# Altium footprint library TranDangKhoa-LIB.PcbLib: 1435 footprints (part 65 of 90)
Each footprint in its own frame and in the unit in brackets; x right, y up, seen from the top. Pads: shape width x height; smd on the part's side, far side on the other; paste and mask are expansions set on the pad; w line width, h text height; cw(c..) or ccw(c..) is an arc to the next point about the centre after c.
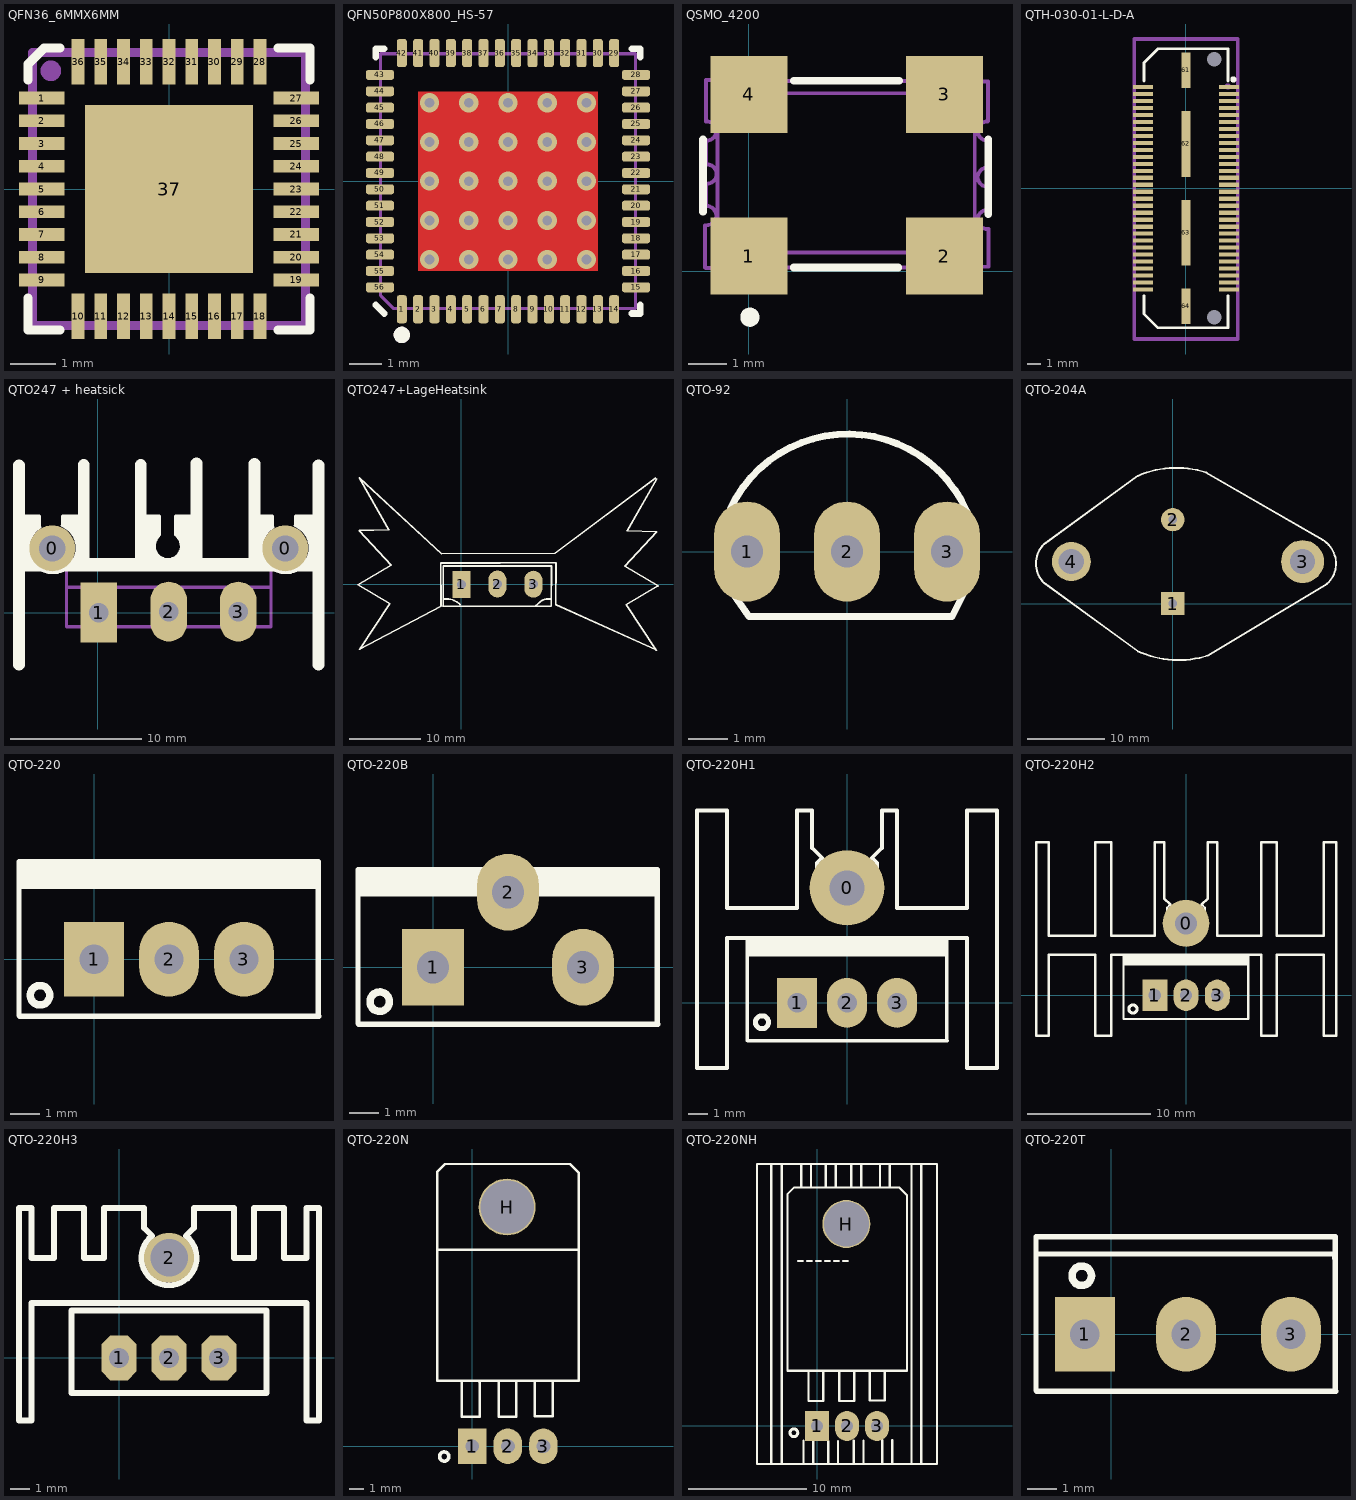
[diagram p64: the footprints below, top view; thin cyan lines are the x and y axes]

## QFN36_6MMX6MM [mm] "Creator MM"
pads (37):
  rect 1x0.28 smd mask+0.025: 1(-2.8,2) 2(-2.8,1.5) 3(-2.8,1) 4(-2.8,0.5) 5(-2.8,0) 6(-2.8,-0.5) 7(-2.8,-1) 8(-2.8,-1.5) 9(-2.8,-2) 19(2.8,-2) 20(2.8,-1.5) 21(2.8,-1) 22(2.8,-0.5) 23(2.8,0) 24(2.8,0.5) 25(2.8,1) 26(2.8,1.5) 27(2.8,2)
  rect 0.28x1 smd mask+0.025: 10(-2,-2.8) 11(-1.5,-2.8) 12(-1,-2.8) 13(-0.5,-2.8) 14(0,-2.8) 15(0.5,-2.8) 16(1,-2.8) 17(1.5,-2.8) 18(2,-2.8) 28(2,2.8) 29(1.5,2.8) 30(1,2.8) 31(0.5,2.8) 32(0,2.8) 33(-0.5,2.8) 34(-1,2.8) 35(-1.5,2.8) 36(-2,2.8)
  rect 3.7x3.7 smd paste-10 mask+0.025: 37(0,0)
Top Overlay:
  lines w0.2: -3.1,-2.4 -3.1,-3.1 -2.4,-3.1 ; -3.1,2.4 -3.1,2.75 -2.75,3.1 -2.4,3.1 ; 2.4,-3.1 3.1,-3.1 3.1,-2.4 ; 2.4,3.1 3.1,3.1 3.1,2.4
Top Paste:
  rectangle: -1.7,0.1 -0.1,1.7
  region: -0.1,-1.7 -0.1,-0.1 -1.7,-0.1 -1.7,-1.7
  region: 1.7,-0.1 0.1,-0.1 0.1,-1.7 1.7,-1.7
  region: 0.1,1.7 0.1,0.1 1.7,0.1 1.7,1.7
Mechanical 16:
  circle w0.254: c-2.6,2.6 r0.1
  lines w0.2: -3,-3 -3,3 3,3 3,-3 -3,-3
Mechanical 29:
  text ".Designator" at -1.2,-0.6 h1.2
3D body "QFN36 (6x6).step": height 0.9, standoff 0.01, extent -3.103,-3.103 3.102,3.102

## QFN50P800X800_HS-57 [mm]
pads (56):
  rrect50% 0.305x0.86 smd mask+0.051: 1(-3.25,-3.92) 14(3.25,-3.92) 29(3.25,3.92) 42(-3.25,3.92)
  rrect50% 0.305x0.86 smd mask+0.038: 2(-2.75,-3.92) 3(-2.25,-3.92) 4(-1.75,-3.92) 5(-1.25,-3.92) 6(-0.75,-3.92) 7(-0.25,-3.92) 8(0.25,-3.92) 9(0.75,-3.92) 10(1.25,-3.92) 11(1.75,-3.92) 12(2.25,-3.92) 13(2.75,-3.92) 30(2.75,3.92) 31(2.25,3.92) 32(1.75,3.92) 33(1.25,3.92) 34(0.75,3.92) 35(0.25,3.92) 36(-0.25,3.92) 37(-0.75,3.92) 38(-1.25,3.92) 39(-1.75,3.92) 40(-2.25,3.92) 41(-2.75,3.92)
  rrect50% 0.86x0.305 smd mask+0.051: 15(3.92,-3.25) 28(3.92,3.25) 43(-3.92,3.25) 56(-3.92,-3.25)
  rrect50% 0.86x0.305 smd mask+0.038: 16(3.92,-2.75) 17(3.92,-2.25) 18(3.92,-1.75) 19(3.92,-1.25) 20(3.92,-0.75) 21(3.92,-0.25) 22(3.92,0.25) 23(3.92,0.75) 24(3.92,1.25) 25(3.92,1.75) 26(3.92,2.25) 27(3.92,2.75) 44(-3.92,2.75) 45(-3.92,2.25) 46(-3.92,1.75) 47(-3.92,1.25) 48(-3.92,0.75) 49(-3.92,0.25) 50(-3.92,-0.25) 51(-3.92,-0.75) 52(-3.92,-1.25) 53(-3.92,-1.75) 54(-3.92,-2.25) 55(-3.92,-2.75)
via -2.4,-1.2 diameter 0.584 hole 0.3
via -2.4,0 diameter 0.584 hole 0.3
via -2.4,-2.4 diameter 0.584 hole 0.3
via -2.4,1.2 diameter 0.584 hole 0.3
via -2.4,2.4 diameter 0.584 hole 0.3
via -1.2,-1.2 diameter 0.584 hole 0.3
via -1.2,0 diameter 0.584 hole 0.3
via -1.2,-2.4 diameter 0.584 hole 0.3
via -1.2,1.2 diameter 0.584 hole 0.3
via -1.2,2.4 diameter 0.584 hole 0.3
via 0,-1.2 diameter 0.584 hole 0.3
via 0,0 diameter 0.584 hole 0.3
via 0,-2.4 diameter 0.584 hole 0.3
via 0,1.2 diameter 0.584 hole 0.3
via 0,2.4 diameter 0.584 hole 0.3
via 1.2,-1.2 diameter 0.584 hole 0.3
via 1.2,0 diameter 0.584 hole 0.3
via 1.2,-2.4 diameter 0.584 hole 0.3
via 1.2,1.2 diameter 0.584 hole 0.3
via 1.2,2.4 diameter 0.584 hole 0.3
via 2.4,-1.2 diameter 0.584 hole 0.3
via 2.4,0 diameter 0.584 hole 0.3
via 2.4,-2.4 diameter 0.584 hole 0.3
via 2.4,1.2 diameter 0.584 hole 0.3
via 2.4,2.4 diameter 0.584 hole 0.3
Top Layer:
  rectangle: -2.75,-2.75 2.75,2.75
Top Overlay:
  circle w0.25: c-3.25,-4.705 r0.125
  lines w0.2: -4.05,-3.79 -3.79,-4.05 ; -4.05,3.79 -4.05,4.05 -3.79,4.05 ; 3.79,-4.05 4.05,-4.05 4.05,-3.79 ; 3.79,4.05 4.05,4.05 4.05,3.79
Top Paste:
  rectangle: -2.54,-2.54 2.54,2.54
Top Solder:
  rectangle: -2.54,-2.54 2.54,2.54
Mechanical 7:
  circle w0.25: c-3.25,-4.705 r0.125
  lines w0.1: -3.9,-3.5 -3.9,3.9 3.9,3.9 3.9,-3.9 -3.5,-3.9 -3.9,-3.5
  text ".Comment" at -3.4,-3.6 h0.8
  text ".Designator" at -3.725,3.2 h0.8
3D body: height 0.55, standoff 0, extent -3.087,-3.089 -2.403,-2.406
3D body: height 0.3, standoff 0.1, extent -3.381,3.589 -3.119,3.85
3D body: height 0.2, standoff 0, extent -3.386,3.707 -3.125,4.275
3D body: height 0.2, standoff 0, extent 3.696,-3.391 4.264,-3.13
3D body: height 0.3, standoff 0.1, extent 3.601,-3.396 3.863,-3.135
3D body: height 0.2, standoff 0, extent 3.696,-2.891 4.264,-2.63
3D body: height 0.3, standoff 0.1, extent 3.601,-2.896 3.863,-2.635
3D body: height 0.2, standoff 0, extent 3.696,-2.391 4.264,-2.13
3D body: height 0.3, standoff 0.1, extent 3.601,-2.396 3.863,-2.135
3D body: height 0.2, standoff 0, extent 3.696,-1.891 4.264,-1.63
3D body: height 0.3, standoff 0.1, extent 3.601,-1.896 3.863,-1.635
3D body: height 0.2, standoff 0, extent 3.696,-1.391 4.264,-1.13
3D body: height 0.3, standoff 0.1, extent 3.601,-1.396 3.863,-1.135
3D body: height 0.2, standoff 0, extent 3.696,-0.891 4.264,-0.63
3D body: height 0.3, standoff 0.1, extent 3.601,-0.896 3.863,-0.635
3D body: height 0.2, standoff 0, extent 3.696,-0.391 4.264,-0.13
3D body: height 0.3, standoff 0.1, extent 3.601,-0.396 3.863,-0.135
3D body: height 0.2, standoff 0, extent 3.696,0.109 4.264,0.37
3D body: height 0.3, standoff 0.1, extent 3.601,0.104 3.863,0.365
3D body: height 0.2, standoff 0, extent 3.696,0.609 4.264,0.87
3D body: height 0.3, standoff 0.1, extent 3.601,0.604 3.863,0.865
3D body: height 0.2, standoff 0, extent 3.696,1.109 4.264,1.37
3D body: height 0.3, standoff 0.1, extent 3.601,1.104 3.863,1.365
3D body: height 0.2, standoff 0, extent 3.696,1.609 4.264,1.87
3D body: height 0.3, standoff 0.1, extent 3.601,1.604 3.863,1.865
3D body: height 0.2, standoff 0, extent 3.696,2.109 4.264,2.37
3D body: height 0.3, standoff 0.1, extent 3.601,2.104 3.863,2.365
3D body: height 0.2, standoff 0, extent 3.696,2.609 4.264,2.87
3D body: height 0.3, standoff 0.1, extent 3.601,2.604 3.863,2.865
3D body: height 0.2, standoff 0, extent 3.696,3.109 4.264,3.37
3D body: height 0.3, standoff 0.1, extent 3.601,3.104 3.863,3.365
3D body: height 0.2, standoff 0, extent 3.113,-4.235 3.374,-3.667
3D body: height 0.3, standoff 0.1, extent 3.108,-3.834 3.369,-3.572
3D body: height 0.2, standoff 0, extent 2.613,-4.235 2.874,-3.667
3D body: height 0.3, standoff 0.1, extent 2.608,-3.834 2.869,-3.572
3D body: height 0.2, standoff 0, extent 2.113,-4.235 2.374,-3.667
3D body: height 0.3, standoff 0.1, extent 2.108,-3.834 2.369,-3.572
3D body: height 0.2, standoff 0, extent 1.613,-4.235 1.874,-3.667
3D body: height 0.3, standoff 0.1, extent 1.608,-3.834 1.869,-3.572
3D body: height 0.2, standoff 0, extent 1.113,-4.235 1.374,-3.667
3D body: height 0.3, standoff 0.1, extent 1.108,-3.834 1.369,-3.572
3D body: height 0.2, standoff 0, extent 0.613,-4.235 0.874,-3.667
3D body: height 0.3, standoff 0.1, extent 0.608,-3.834 0.869,-3.572
3D body: height 0.2, standoff 0, extent 0.113,-4.235 0.374,-3.667
3D body: height 0.3, standoff 0.1, extent 0.108,-3.834 0.369,-3.572
3D body: height 0.2, standoff 0, extent -0.387,-4.235 -0.126,-3.667
3D body: height 0.3, standoff 0.1, extent -0.392,-3.834 -0.131,-3.572
3D body: height 0.2, standoff 0, extent -0.887,-4.235 -0.626,-3.667
3D body: height 0.3, standoff 0.1, extent -0.892,-3.834 -0.631,-3.572
3D body: height 0.2, standoff 0, extent -1.387,-4.235 -1.126,-3.667
3D body: height 0.3, standoff 0.1, extent -1.392,-3.834 -1.131,-3.572
3D body: height 0.2, standoff 0, extent -1.887,-4.235 -1.626,-3.667
3D body: height 0.3, standoff 0.1, extent -1.892,-3.834 -1.631,-3.572
3D body: height 0.2, standoff 0, extent -2.387,-4.235 -2.126,-3.667
3D body: height 0.3, standoff 0.1, extent -2.392,-3.834 -2.131,-3.572
3D body: height 0.2, standoff 0, extent -2.887,-4.235 -2.626,-3.667
3D body: height 0.3, standoff 0.1, extent -2.892,-3.834 -2.631,-3.572
3D body: height 0.2, standoff 0, extent -3.387,-4.235 -3.126,-3.667
3D body: height 0.3, standoff 0.1, extent -3.392,-3.834 -3.131,-3.572
3D body: height 0.3, standoff 0.1, extent -3.868,-3.361 -3.354,-3.099
3D body: height 0.2, standoff 0, extent -4.316,-3.356 -3.748,-3.095
3D body: height 0.2, standoff 0, extent -4.316,-2.865 -3.748,-2.604
3D body: height 0.3, standoff 0.1, extent -3.868,-2.87 -3.606,-2.608
3D body: height 0.2, standoff 0, extent -4.301,-0.856 -3.733,-0.595
3D body: height 0.3, standoff 0.1, extent -3.862,-0.862 -3.601,-0.601
3D body: height 0.2, standoff 0, extent -4.301,-1.384 -3.733,-1.123
3D body: height 0.3, standoff 0.1, extent -3.862,-1.39 -3.601,-1.129
3D body: height 0.2, standoff 0, extent -4.301,-1.884 -3.733,-1.623
3D body: height 0.3, standoff 0.1, extent -3.862,-1.89 -3.601,-1.629
3D body: height 0.2, standoff 0, extent -4.301,-2.368 -3.733,-2.107
3D body: height 0.3, standoff 0.1, extent -3.862,-2.374 -3.601,-2.113
3D body: height 0.2, standoff 0, extent -4.297,1.146 -3.729,1.407
3D body: height 0.3, standoff 0.1, extent -3.858,1.14 -3.597,1.402
3D body: height 0.2, standoff 0, extent -4.297,0.654 -3.729,0.915
3D body: height 0.3, standoff 0.1, extent -3.858,0.648 -3.597,0.91
3D body: height 0.2, standoff 0, extent -4.297,0.142 -3.729,0.403
3D body: height 0.3, standoff 0.1, extent -3.858,0.136 -3.597,0.398
3D body: height 0.2, standoff 0, extent -4.293,-0.35 -3.725,-0.089
3D body: height 0.3, standoff 0.1, extent -3.854,-0.356 -3.593,-0.094
3D body: height 0.3, standoff 0.1, extent -3.854,3.13 -3.593,3.392
3D body: height 0.2, standoff 0, extent -4.293,3.136 -3.725,3.397
3D body: height 0.2, standoff 0, extent -4.293,2.636 -3.725,2.897
3D body: height 0.3, standoff 0.1, extent -3.854,2.63 -3.593,2.892
3D body: height 0.2, standoff 0, extent -4.293,2.136 -3.725,2.397
3D body: height 0.3, standoff 0.1, extent -3.854,2.13 -3.593,2.392
3D body: height 0.2, standoff 0, extent -4.293,1.636 -3.725,1.897
3D body: height 0.3, standoff 0.1, extent -3.854,1.63 -3.593,1.892
3D body: height 0.2, standoff 0, extent -1.357,3.714 -1.095,4.282
3D body: height 0.3, standoff 0.1, extent -1.363,3.582 -1.101,3.843
3D body: height 0.2, standoff 0, extent -1.857,3.714 -1.595,4.282
3D body: height 0.3, standoff 0.1, extent -1.863,3.582 -1.601,3.843
3D body: height 0.2, standoff 0, extent -2.357,3.714 -2.095,4.282
3D body: height 0.3, standoff 0.1, extent -2.363,3.582 -2.101,3.843
3D body: height 0.2, standoff 0, extent -2.857,3.714 -2.595,4.282
3D body: height 0.3, standoff 0.1, extent -2.863,3.582 -2.601,3.843
3D body: height 0.2, standoff 0, extent 0.645,3.706 0.907,4.274
3D body: height 0.3, standoff 0.1, extent 0.64,3.574 0.901,3.835
3D body: height 0.2, standoff 0, extent 0.145,3.706 0.407,4.274
3D body: height 0.3, standoff 0.1, extent 0.14,3.574 0.401,3.835
3D body: height 0.2, standoff 0, extent -0.355,3.706 -0.093,4.274
3D body: height 0.3, standoff 0.1, extent -0.36,3.574 -0.099,3.835
3D body: height 0.2, standoff 0, extent -0.855,3.706 -0.593,4.274
3D body: height 0.3, standoff 0.1, extent -0.86,3.574 -0.599,3.835
3D body: height 0.3, standoff 0.1, extent 1.637,3.581 1.898,3.842
3D body: height 0.2, standoff 0, extent 1.642,3.713 1.904,4.281
3D body: height 0.3, standoff 0.1, extent 2.137,3.581 2.398,3.842
3D body: height 0.2, standoff 0, extent 2.142,3.713 2.404,4.281
3D body: height 0.3, standoff 0.1, extent 2.637,3.581 2.898,3.842
3D body: height 0.2, standoff 0, extent 2.642,3.713 2.904,4.281
3D body: height 0.3, standoff 0.1, extent 3.137,3.581 3.398,3.842
3D body: height 0.2, standoff 0, extent 3.142,3.713 3.404,4.281
3D body: height 0.2, standoff 0, extent 1.137,3.713 1.399,4.281
3D body: height 0.3, standoff 0.1, extent 1.131,3.58 1.393,3.842
3D body: height 0.5, standoff 0, extent -3.67,-3.643 3.649,3.573

## QSMO_4200 [mm]
pads (4):
  rect 2x2 smd: 1(0,0.4) 2(5.08,0.4) 3(5.08,4.6) 4(0,4.6)
Top Overlay:
  circle w0.25: c0.025,-1.19 r0.125
  lines w0.2: -1.194,1.549 -1.194,3.429 ; 1.162,4.953 3.912,4.953 ; 1.168,0.102 3.886,0.102 ; 6.223,1.489 6.223,3.429
Mechanical 15:
  lines w0.1: -1.143,0.102 -1.143,1.194 ; -1.12,0.09 -0.27,0.09 -0.29,0.11 ; -1.12,3.9 -1.12,4.98 -0.26,4.98 ; -1.118,1.702 -1.118,2.286 ; -1.118,2.794 -1.118,3.378 ; -1.1,1.2 ccw(c-1.1,1.45) -1.1,1.7 ; -1.1,3.4 ccw(c-1.1,3.65) -1.1,3.9 ; -1.09,2.28 ccw(c-1.09,2.53) -1.09,2.78 ; -0.83,0.49 5.87,0.49 5.87,4.63 -0.82,4.63 -0.82,3.91 -0.82,0.51 ; -0.3,0.15 cw(c-0.05,0.15) 0.2,0.15 ; -0.23,4.91 ccw(c0.02,4.91) 0.27,4.91 ; 0.19,0.1 4.78,0.1 ; 0.25,4.95 4.87,4.95 ; 4.8,0.16 cw(c5.05,0.16) 5.3,0.16 ; 4.88,4.91 ccw(c5.13,4.91) 5.38,4.91 ; 5.29,0.12 6.23,0.12 6.23,1.1 ; 5.35,4.94 6.22,4.94 6.22,3.91 ; 6.198,1.62 6.198,2.184 ; 6.2,1.1 cw(c6.2,1.35) 6.2,1.6 ; 6.2,2.2 cw(c6.2,2.45) 6.2,2.7 ; 6.2,3.4 cw(c6.2,3.65) 6.2,3.9 ; 6.223,2.704 6.223,3.378

## QTH-030-01-L-D-A [mm]
pads (66):
  rect 1.45x0.3 smd mask+0.025: 1(3.09,7.25) 2(-3.09,7.25) 3(3.09,6.75) 4(-3.09,6.75) 5(3.09,6.25) 6(-3.09,6.25) 7(3.09,5.75) 8(-3.09,5.75) 9(3.09,5.25) 10(-3.09,5.25) 11(3.09,4.75) 12(-3.09,4.75) 13(3.09,4.25) 14(-3.09,4.25) 15(3.09,3.75) 16(-3.09,3.75) 17(3.09,3.25) 18(-3.09,3.25) 19(3.09,2.75) 20(-3.09,2.75) 21(3.09,2.25) 22(-3.09,2.25) 23(3.09,1.75) 24(-3.09,1.75) 25(3.09,1.25) 26(-3.09,1.25) 27(3.09,0.75) 28(-3.09,0.75) 29(3.09,0.25) 30(-3.09,0.25) 31(3.09,-0.25) 32(-3.09,-0.25) 33(3.09,-0.75) 34(-3.09,-0.75) 35(3.09,-1.25) 36(-3.09,-1.25) 37(3.09,-1.75) 38(-3.09,-1.75) 39(3.09,-2.25) 40(-3.09,-2.25) 41(3.09,-2.75) 42(-3.09,-2.75) 43(3.09,-3.25) 44(-3.09,-3.25) 45(3.09,-3.75) 46(-3.09,-3.75) 47(3.09,-4.25) 48(-3.09,-4.25) 49(3.09,-4.75) 50(-3.09,-4.75) 51(3.09,-5.25) 52(-3.09,-5.25) 53(3.09,-5.75) 54(-3.09,-5.75) 55(3.09,-6.25) 56(-3.09,-6.25) 57(3.09,-6.75) 58(-3.09,-6.75) 59(3.09,-7.25) 60(-3.09,-7.25)
  rect 0.64x2.54 smd mask+0.025: 61(0,8.445) 64(0,-8.445)
  rect 0.64x4.7 smd mask+0.025: 62(0,3.175) 63(0,-3.175)
  round 0 hole 1.05 unplated: 65(2.03,-9.24) 66(2.03,9.24)
Top Overlay:
  circle w0.254: c3.4,7.8 r0.1
  lines w0.2: -3,-7.7 -3,-9 -2,-10 3,-10 3,-7.7 ; -3,7.7 -3,9 -2,10 3,10 3,7.7
Mechanical 16:
  circle w0.254: c3,7.3 r0.1
  lines w0.254: -3.7,-10.8 -3.7,10.7 3.7,10.7 3.7,-10.8 -3.7,-10.8
Mechanical 29:
  text ".Designator" at 1.3,0 h1.52
3D body "QTH-030-01-X-D-A.step": height 4.26, standoff -0.74, extent -3.55,-10.002 3.562,10

## QTO247 + heatsick [mil]
pads (5):
  round 137.8 hole 78.74: 0(-136.34,194) 0(563.66,194)
  rect 110x180 hole 59.06: 1(3,1)
  oval 110x180 hole 59.06: 2(213.66,4) 3(422.32,4)
Top Overlay:
  region: 230,290 290,290 290,150 280,160 230,160 250,180 250,220 230,240
  region: 140,290 190,290 190,240 170,220 170,180 190,160 140,160
  region: -105,290 -105,265 -85,245 -80,245 -70,235 -70,225 -65,220 -65,160 -40,160 -35,165 -50,180 -50,290
  region: -225,290 -175,290 -175,255 -180,255 -200,235 -200,225 -210,215 -210,180 -205,175 -205,160 -225,160
  region: 475,290 525,290 525,255 520,255 500,235 500,225 490,215 490,180 495,175 495,160 475,160
  region: 595,290 595,265 615,245 620,245 630,235 630,225 635,220 635,160 660,160 665,165 650,180 650,290
  lines w10: -225,290 -175,290 -175,260 ; -173.69,257.87 ccw(c-135,195) -105.92,262.86 ; -163.31,220 ccw(c-134.15,190.85) -105,220 ; -105,265 -105,290 -55,290 ; 130,290 185,290 185,235 180,230 ; 181.96,229.73 ccw(c210.85,200.85) 239.73,229.73 ; 240,230 235,235 235,290 280,290 ; 475,290 525,290 525,260 ; 526.31,257.87 ccw(c565,195) 594.08,262.86 ; 595,265 595,290 645,290
  lines w35: -236.34,-156 -236.34,444 ; -42,149 -42,445 ; 129,149 129,445 ; 297,148 297,450 ; 471,148 471,448 ; 663.66,-156 663.66,444
  lines w40: -230,145 655,145
Mechanical 1:
  lines w10: -93.43,76.83 520.75,76.83 ; -93.43,-41.28 520.75,-41.28 520.75,135.89 -93.43,135.89 -93.43,-41.28
3D body "SW3dPS-TO-247.STEP": height 940.6, standoff -479.4, extent -92,-73 508,107
3D body "User Library-heat sink-1.STEP": height 1206.11, standoff 0.6, extent -252.79,-166.67 648.79,479

## QTO247+LageHeatsink [mil]
pads (3):
  rect 100x150 hole 50: 1(0,-1)
  oval 100x150 hole 50: 2(200,1) 3(400,0)
Top Overlay:
  lines w10: -102,-121 -101,-120 -101,102 501,102 500,-122 -101,-122 -100,-121 ; -100,-82 -80.43,-82 cw(c-80.43,-184.43) -8,-112 ; 208,119 526,119 524,-113 1082,-364 ; 214,118 -115,118 -113,-122 -566,-361 -398,-108 -575,-3 -391,106 -568,298 -403,303 -568,592 -111,170 520,172 1078,590 ; 415,-119 ccw(c415,-116.59) 416.71,-118.29 434,-101 cw(c479.87,-146.87) 479.87,-82 499,-82 ; 1084,-367 916,-114 1093,-9 909,100 1086,292 921,297 1086,586
3D body "SW3dPS-to-247ad.STEP": height 1006.77, standoff -610.16, extent -108.98,-107 518.98,91.03
3D body "SW3dPS-aavid 6298b.STEP": height 1100, standoff 100, extent -619,-329 1031,633

## QTO-92 [mil] "TO-92"
height 200
pads (3):
  oval 66x100 hole 32: 1(-100,0) 2(0,0) 3(100,0)
Top Overlay:
  lines w7: -116.52,43.21 cw(c0.97,-12.43) 119.94,39.97 ; -115.34,-40.24 -98,-65 105,-65 118,-39
3D body "SW3dPS-TO92.STEP": height 245.04, standoff -199.79, extent -108.87,-65.56 108.86,95

## QTO-204A [mil] "Pin For 2N3055, 2N2955"
pads (4):
  rect 120x120 hole 45: 1(0,0)
  round 120 hole 45: 2(0,430)
  round 220 hole 130: 3(665,215)
  round 200 hole 130: 4(-520,215)
Top Overlay:
  lines w10: -660,105 cw(c-560,205) -660,305 -179.46,654.16 ; -659.88,104.89 -178.69,-244.72 ; -179.53,654.34 cw(c18.37,195.17) 171.59,671.11 ; -178.9,-245.19 ccw(c28.37,209.83) 180.47,-266.47 ; 171.46,670.71 769.34,325.52 ; 180.28,-266.15 789.88,100.13 ccw(c695,205) 769.25,325.36

## QTO-220 [mil] "TO-220 - 1-2-3"
height 200
pads (3):
  rect 80x100 hole 39: 1(0,0)
  oval 80x100 hole 39: 2(100,0) 3(200,0)
Top Overlay:
  circle w10: c-72.03,-48 r12.97
  rectangle: -99,94 300,130
  lines w7: 298,107 299,93 ; -100,-75 -100,130 299,130 299,-75 300,-76 -76,-76 -99,-76 -100,-75
3D body "SW3dPS-TO220AB.STEP": height 754.72, standoff -400, extent -120.73,-84.65 320.73,100

## QTO-220B [mm] "TO-220 - 1-2-3"
height 5.08
pads (3):
  rect 2.1x2.6 hole 1.1: 1(0,0)
  oval 2.1x2.6 hole 1.1: 2(2.54,2.54) 3(5.08,0)
Top Overlay:
  circle w0.254: c-1.804,-1.168 r0.329
  rectangle: -2.515,2.388 7.62,3.302
  lines w0.178: 7.569,2.718 7.595,2.362 ; -2.54,-1.905 -2.515,-1.93 -1.93,-1.93 7.62,-1.93 7.595,-1.905 7.595,3.302 -2.54,3.302 -2.54,-1.905
3D body "User Library-TO-220-1.STEP": height 20.58, standoff -8.2, extent -2.356,-2.062 7.544,2.438

## QTO-220H1 [mil] "TO-220 - 1-2-3"
height 200
pads (4):
  round 150 hole 70: 0(0,230)
  rect 80x100 hole 39: 1(-100,0)
  oval 80x100 hole 39: 2(0,0) 3(100,0)
Top Overlay:
  circle w10: c-170.03,-39 r12.97
  rectangle: -201,93 198,129
  lines w7: -200,100 198.5,100 199,93 ; -200,-75 -199,-76 -176,-76 200,-76 199,-75 199,130 -200,130 -200,-75
  lines w8: -300,-130 -300,385 -240,385 -240,190 -100,190 -100,385 -70,385 -70,310 -50,290 -60,280 -60,210 -40,190 40,190 60,210 60,280 50,290 70,310 70,385 100,385 100,190 240,190 240,385 300,385 300,-130 240,-130 240,130 -240,130 -240,-130 -300,-130
3D body "User Library-Disipador 34M8491-1.STEP": height 1000, standoff -122.05, extent -246,73.03 250.06,328.97
3D body "User Library-TO-220-1.STEP": height 850.24, standoff -282.83, extent -194.88,-82 194.88,95.17

## QTO-220H2 [mil] "TO-220 - 1-2-3"
height 200
pads (4):
  round 150 hole 70: 0(0,230)
  rect 80x100 hole 39: 1(-100,0)
  oval 80x100 hole 39: 2(0,0) 3(100,0)
Top Overlay:
  circle w10: c-169.97,-44 r12.97
  rectangle: -201,95 198,131
  lines w7: -200,100 198.5,100 199,93 ; -200,-75 -200,130 199,130 199,-75 200,-76 -176,-76 -199,-76 -200,-75
  lines w8: -480,-130 -440,-130 -440,130 -290,130 -290,-130 -240,-130 -240,130 240,130 240,-130 290,-130 290,130 440,130 440,-130 480,-130 480,490 440,490 440,190 290,190 290,490 240,490 240,190 100,190 100,490 70,490 70,310 50,290 60,280 60,210 40,190 -40,190 -60,210 -60,280 -50,290 -70,310 -70,490 -100,490 -100,190 -240,190 -240,490 -290,490 -290,190 -440,190 -440,490 -480,490 -480,-130
3D body "User Library-heat sink-1.STEP": height 1205.51, standoff 0, extent -448.79,-177 452.79,468.67
3D body "User Library-TO-220-1.STEP": height 810.24, standoff -322.83, extent -194.76,-82.17 195,95

## QTO-220H3 [mil] "TO-220 1-2-3"
pads (4):
  oct 70x90 hole 40: 1(0,0) 2(100,0) 3(200,0)
  round 100 hole 75: 2(100,200)
Top Overlay:
  lines w12: 66,244 50,260 50,300 -30,300 -30,200 -70,200 -70,300 -130,300 -130,200 -175,200 -175,300 -200,300 -200,-125 -175,-125 -175,110 375,110 375,-125 400,-125 400,300 375,300 375,200 330,200 330,300 270,300 270,200 230,200 230,300 150,300 150,260 133.59,243.59 ; 66.37,243.52 ccw(c100,200) 133.77,243.41 ; -95,-70 -95,95 295,95 295,-70 -95,-70
3D body "SW3dPS-heatsink TO126.STEP": height 984.25, standoff -149.61, extent -193.91,-102.25 388.03,323
3D body "User Library-TO-220-1.STEP": height 322.83, standoff -810.24, extent -96.88,-76.17 292.88,101

## QTO-220N [mil] "TO-220 - 1-2-3"
height 200
pads (4):
  rect 80x100 hole 39: 1(0,0)
  oval 80x100 hole 39: 2(100,0) 3(200,0)
  round 160 hole 150: H(98,673)
Top Overlay:
  circle w10: c-79.03,-29 r12.97
  lines w7: -99,549 -99,772 -77,794 275,794 300,769 300,730 ; -99,552 -99,184 300,184 300,553 -98,553 ; -29,178 -29,83 21,83 21,180 20,181 ; 74,178 74,83 124,83 124,180 123,181 ; 176,180 176,85 226,85 226,182 225,183 ; 300,552 300,733
3D body "SW3dPS-mje-700 and 800.STEP": height 121, standoff -160, extent -48,-10.31 252,792.31

## QTO-220NH [mil] "TO-220 - 1-2-3"
height 200
pads (4):
  rect 80x100 hole 39: 1(0,0)
  oval 80x100 hole 39: 2(100,0) 3(200,0)
  round 160 hole 150: H(98,673)
Top Overlay:
  circle w10: c-77.03,-23 r12.97
  lines w7: -99,549 -99,772 -77,794 275,794 300,769 300,730 ; -99,552 -99,184 300,184 300,553 ; -29,178 -29,83 21,83 21,180 20,181 ; 74,178 74,83 124,83 124,180 123,181 ; 176,180 176,85 226,85 226,182 225,183 ; 300,552 300,733
  lines w8: -152,-127 -152,873 ; -117,-127 -117,873 ; -53,796 -53.01,869.97 ; -45,-124 -45.01,-50.03 ; -20,796 -20.01,869.97 ; -12,-124 -12.01,-50.03 ; 29,795 28.99,868.97 ; 37,-125 36.99,-51.03 ; 62,795 61.99,868.97 ; 70,-125 69.99,-51.03 ; 114,796 113.99,869.97 ; 122,-124 121.99,-50.03 ; 147,796 146.99,869.97 ; 155,-124 154.99,-50.03 ; 210,798 209.99,871.97 ; 218,-122 217.99,-48.03 ; 243,798 242.99,871.97 ; 251,-122 250.99,-48.03 ; 315,-127 315,873 ; 348,-127 348,873 ; -200,-127 -200,873 400,873 400,-127 -200,-127
  text "------" at -69,527 h60
3D body "SW3DPS-TO-220-DEFAULT.STEP": height 165.35, standoff -118.11, extent -100,-3.66 300,763.66

## QTO-220T [mil] "TO-220 - 1-2-3"
height 200
pads (3):
  rect 80x100 hole 39: 1(-35,0)
  oval 80x100 hole 39: 2(100,0) 3(240,0)
Top Overlay:
  circle w10: c-38.97,78 r12.97
  lines w7: -100,107 298,107 299,93 ; -100,-75 -99,-76 -76,-76 300,-76 299,-75 299,130 -100,130 -100,-75
3D body "SW3dPS-Transistor TO 220.STEP": height 622.65, standoff -393.1, extent -103.76,-69 301.76,108.16